# Altium footprint library SparkFun-Connectors.PCBLIB: 409 footprints (part 14 of 26)
Each footprint in its own frame and in the unit in brackets; x right, y up, seen from the top. Pads: shape width x height; smd on the part's side, far side on the other; paste and mask are expansions set on the pad; w line width, h text height; cw(c..) or ccw(c..) is an arc to the next point about the centre after c.
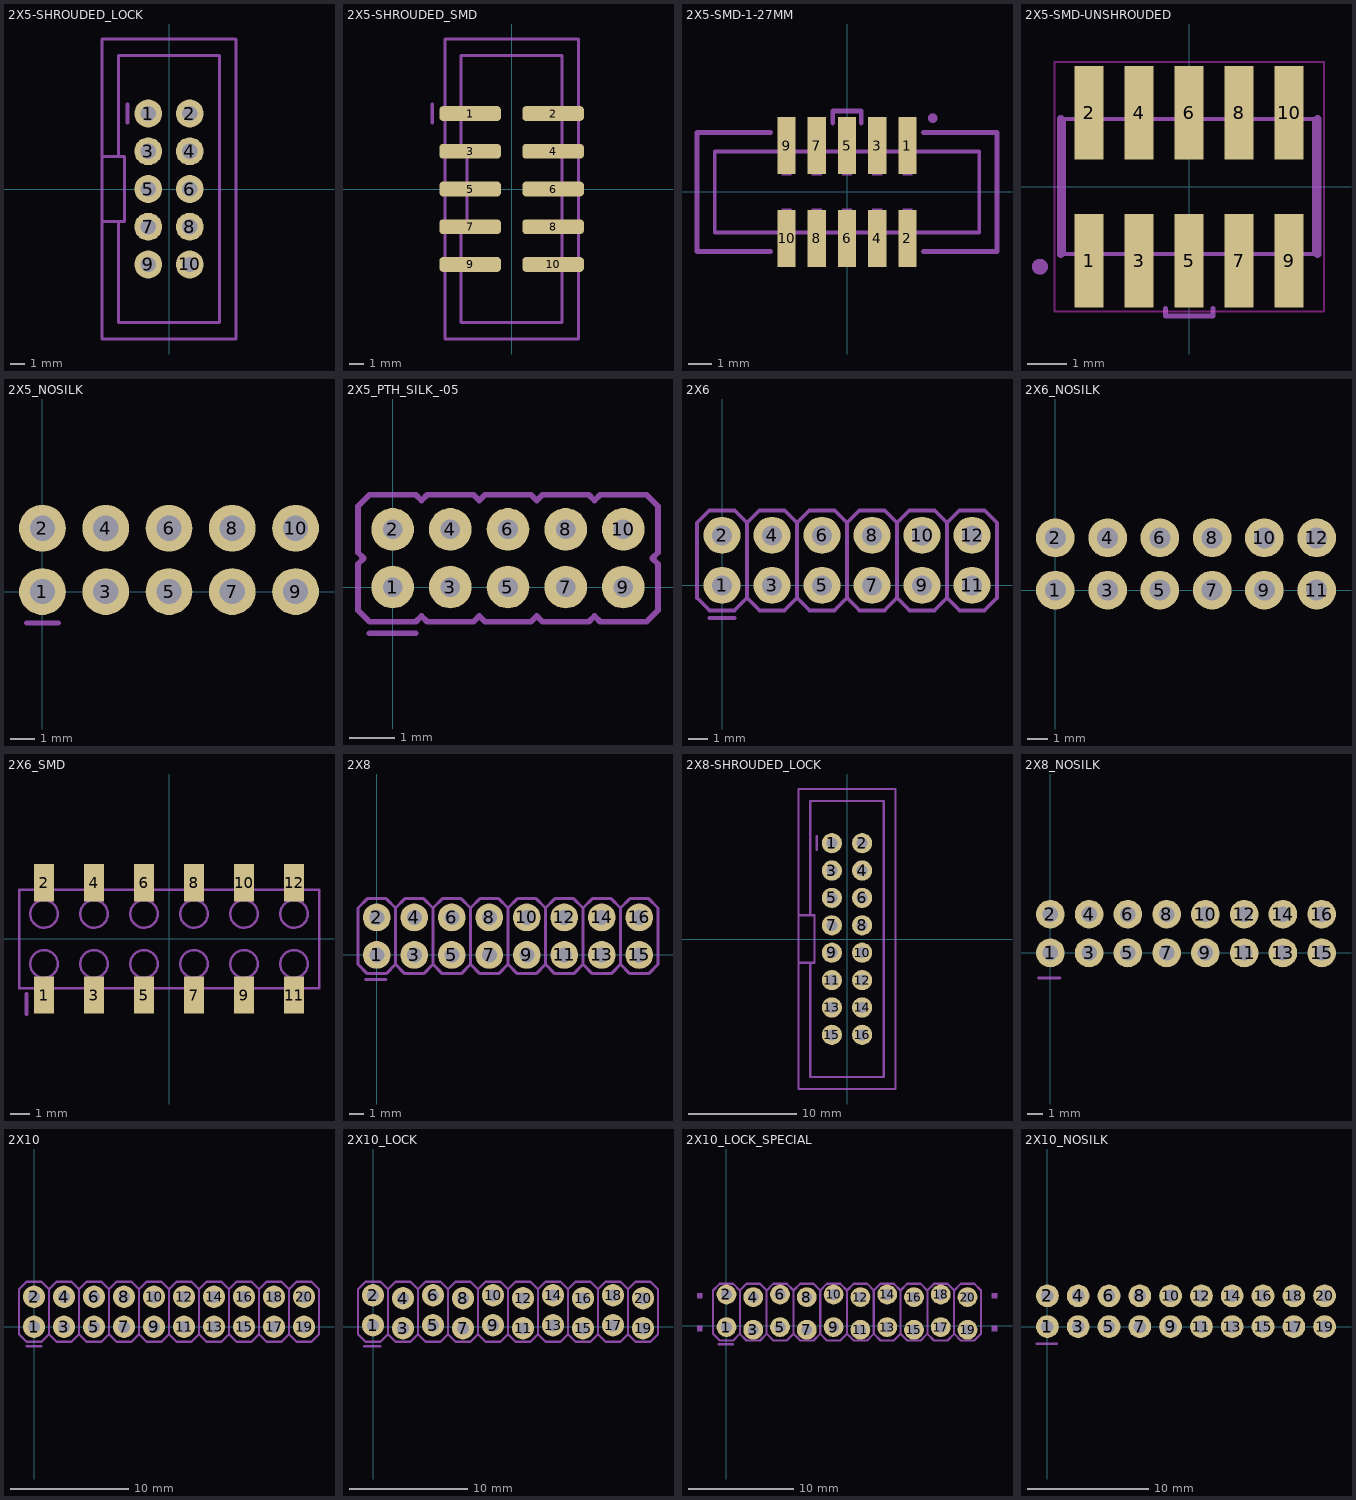
[diagram p13: the footprints below, top view; thin cyan lines are the x and y axes]

## 2X5-SHROUDED_LOCK [mil]
pads (10):
  round 74 hole 40: 1(-55,200) 2(55,200) 3(-55,100) 4(55,100) 5(-55,0) 6(55,0) 7(-55,-100) 8(55,-100) 9(-55,-200) 10(55,-200)
tDocu:
  region: -60,210 -40,210 -40,190 -60,190
  region: 40,210 60,210 60,190 40,190
  region: 40,110 60,110 60,90 40,90
  region: -60,110 -40,110 -40,90 -60,90
  region: 40,10 60,10 60,-10 40,-10
  region: -60,10 -40,10 -40,-10 -60,-10
  region: 40,-90 60,-90 60,-110 40,-110
  region: -60,-90 -40,-90 -40,-110 -60,-110
  region: 40,-190 60,-190 60,-210 40,-210
  region: -60,-190 -40,-190 -40,-210 -60,-210
  region: -60,-90 -40,-90 -40,-110 -60,-110
  region: 40,-90 60,-90 60,-110 40,-110
  lines w8: -133.86,-86.61 -133.86,-354.33 133.86,-354.33 133.86,354.33 -133.86,354.33 -133.86,86.61
tPlace:
  lines w8: -109.25,175 -109.25,225 ; 173.23,397.64 -177.17,397.64 -177.17,86.61 ; 177.17,397.64 177.17,-397.64 -177.17,-397.64 -177.17,-86.61 ; -177.17,-86.61 -177.17,86.61 ; -177.17,-86.61 -118.11,-86.61 -118.11,86.61 -177.17,86.61
bPlace:
  lines w8: -110.75,175 -110.75,225

## 2X5-SHROUDED_SMD [mil]
pads (10):
  rrect50% 163.39x39.37 smd: 1(-110,200) 2(110,200) 3(-110,100) 4(110,100) 5(-110,0) 6(110,0) 7(-110,-100) 8(110,-100) 9(-110,-200) 10(110,-200)
tDocu:
  region: -60,190 -60,210 -40,210 -40,190
  region: 40,190 40,210 60,210 60,190
  region: 40,90 40,110 60,110 60,90
  region: -60,90 -60,110 -40,110 -40,90
  region: 40,-10 40,10 60,10 60,-10
  region: -60,-10 -60,10 -40,10 -40,-10
  region: 40,-110 40,-90 60,-90 60,-110
  region: -60,-110 -60,-90 -40,-90 -40,-110
  region: 40,-210 40,-190 60,-190 60,-210
  region: -60,-210 -60,-190 -40,-190 -40,-210
  region: -60,-110 -60,-90 -40,-90 -40,-110
  region: 40,-110 40,-90 60,-90 60,-110
  lines w8: -133.86,-86.61 -133.86,-354.33 133.86,-354.33 133.86,354.33 -133.86,354.33 -133.86,86.61
tPlace:
  lines w8: -209.25,175 -209.25,225 ; 173.23,397.64 -177.17,397.64 -177.17,86.61 ; 177.17,397.64 177.17,-397.64 -177.17,-397.64 -177.17,-86.61 ; -177.17,-86.61 -177.17,86.61 ; -177.17,-86.61 -118.11,-86.61 -118.11,86.61 -177.17,86.61
bPlace:
  lines w8: -210.75,175 -210.75,225

## 2X5-SMD-1-27MM [mil]
pads (10):
  rect 29.92x94.49 smd: 1(100,76.77) 2(100,-76.77) 3(50,76.77) 4(50,-76.77) 5(0,76.77) 6(0,-76.77) 7(-50,76.77) 8(-50,-76.77) 9(-100,76.77) 10(-100,-76.77)
tDocu:
  region: -8.07,-27.56 8.07,-27.56 8.07,-110.82 -8.07,-110.82
  region: -58.07,-27.56 -41.93,-27.56 -41.93,-110.82 -58.07,-110.82
  region: -108.07,-27.56 -91.93,-27.56 -91.93,-110.82 -108.07,-110.82
  region: 41.93,-27.56 58.07,-27.56 58.07,-110.82 41.93,-110.82
  region: 91.93,-27.56 108.07,-27.56 108.07,-110.82 91.93,-110.82
  region: 108.07,27.56 91.93,27.56 91.93,110.82 108.07,110.82
  region: 58.07,27.56 41.93,27.56 41.93,110.82 58.07,110.82
  region: 8.07,27.56 -8.07,27.56 -8.07,110.82 8.07,110.82
  region: -41.93,27.56 -58.07,27.56 -58.07,110.82 -41.93,110.82
  region: -91.93,27.56 -108.07,27.56 -108.07,110.82 -91.93,110.82
  lines w6: -218.5,-66.93 218.5,-66.93 218.5,66.93 -218.5,66.93 -218.5,-66.93
tPlace:
  circle w8: c141.73,122.05 r3.94
  lines w8: -125.98,-98.43 -248.03,-98.43 -248.03,98.43 -125.98,98.43 ; -23.62,114.17 -23.62,133.86 23.62,133.86 23.62,114.17 ; 125.98,-98.43 248.03,-98.43 248.03,98.43 125.98,98.43

## 2X5-SMD-UNSHROUDED [mm]
pads (10):
  rect 0.74x2.38 smd: 1(-2.54,-1.88) 2(-2.54,1.88) 3(-1.27,-1.88) 4(-1.27,1.88) 5(0,-1.88) 6(0,1.88) 7(1.27,-1.88) 8(1.27,1.88) 9(2.54,-1.88) 10(2.54,1.88)
Top keep-out:
  lines w0.05: -3.425,-3.17 -3.425,3.17 3.425,3.17 3.425,-3.17 -3.425,-3.17
tDocu:
  circle w0.2: c-3.79,-2.035 r0.1
  lines w0.1: -3.175,-1.715 -3.175,1.715 3.175,1.715 3.175,-1.715 -3.175,-1.715
tPlace:
  circle w0.2: c-3.79,-2.035 r0.1
  lines w0.127: -0.6,-3.09 -0.6,-3.29 0.6,-3.29 0.6,-3.09
  lines w0.2: -3.26,-1.715 -3.26,1.715 ; 3.26,-1.715 3.26,1.715

## 2X5_NOSILK [mil]
pads (10):
  round 74 hole 40: 1(0,0) 2(0,100) 3(100,0) 4(100,100) 5(200,0) 6(200,100) 7(300,0) 8(300,100) 9(400,0) 10(400,100)
tDocu:
  region: 10,-10 -10,-10 -10,10 10,10
  region: 10,90 -10,90 -10,110 10,110
  region: 110,90 90,90 90,110 110,110
  region: 110,-10 90,-10 90,10 110,10
  region: 210,-10 190,-10 190,10 210,10
  region: 410,90 390,90 390,110 410,110
  region: 410,-10 390,-10 390,10 410,10
  region: 310,-10 290,-10 290,10 310,10
  region: 310,90 290,90 290,110 310,110
  region: 210,90 190,90 190,110 210,110
  lines w8: -25,-50 25,-50

## 2X5_PTH_SILK_-05 [mil]
pads (10):
  round 37 hole 17: 1(0,0) 2(0,50) 3(50,0) 4(50,50) 5(100,0) 6(100,50) 7(150,0) 8(150,50) 9(200,0) 10(200,50)
tPlace:
  lines w5: -20,-40 20,-40 ; -30,-20 -20,-30 20,-30 25,-25 30,-30 70,-30 75,-25 80,-30 120,-30 125,-25 130,-30 170,-30 175,-25 180,-30 220,-30 230,-20 230,20 225,25 230,30 230,70 220,80 180,80 175,75 170,80 130,80 125,75 120,80 80,80 75,75 70,80 30,80 25,75 20,80 -20,80 -30,70 -30,30 -25,25 -30,20 -30,-20
bPlace:
  lines w5: -20,-40 20,-40

## 2X6 [mil]
pads (12):
  round 74 hole 40: 1(0,0) 2(0,100) 3(100,0) 4(100,100) 5(200,0) 6(200,100) 7(300,0) 8(300,100) 9(400,0) 10(400,100) 11(500,0) 12(500,100)
tDocu:
  region: -10,-10 -10,10 10,10 10,-10
  region: -10,90 -10,110 10,110 10,90
  region: 90,90 90,110 110,110 110,90
  region: 90,-10 90,10 110,10 110,-10
  region: 190,90 190,110 210,110 210,90
  region: 190,-10 190,10 210,10 210,-10
  region: 290,90 290,110 310,110 310,90
  region: 390,90 390,110 410,110 410,90
  region: 490,90 490,110 510,110 510,90
  region: 290,-10 290,10 310,10 310,-10
  region: 390,-10 390,10 410,10 410,-10
  region: 490,-10 490,10 510,10 510,-10
tPlace:
  lines w8: -25,-65 25,-65 ; -50,-25 -25,-50 ; -50,-25 -50,125 ; -50,-25 -25,-50 ; -50,-25 -50,125 ; -50,-25 -25,-50 ; -50,-25 -50,125 ; -50,125 -25,150 ; -50,125 -25,150 ; -50,125 -25,150 ; -25,-50 25,-50 50,-25 ; -25,150 25,150 50,125 ; 50,-25 75,-50 125,-50 150,-25 ; 50,-25 50,125 ; 50,125 75,150 125,150 150,125 ; 150,-25 175,-50 225,-50 250,-25 ; 150,-25 150,125 ; 150,125 175,150 225,150 250,125 ; 250,-25 275,-50 325,-50 350,-25 ; 250,-25 250,125 ; 250,125 275,150 325,150 350,125 ; 350,-25 375,-50 425,-50 450,-25 ; 350,-25 350,125 ; 350,125 375,150 425,150 450,125 ; 450,-25 475,-50 525,-50 550,-25 550,125 525,150 475,150 450,125 ; 450,-25 450,125
bPlace:
  lines w8: -25,-65 25,-65

## 2X6_NOSILK [mil]
pads (12):
  round 74 hole 40: 1(0,0) 2(0,100) 3(100,0) 4(100,100) 5(200,0) 6(200,100) 7(300,0) 8(300,100) 9(400,0) 10(400,100) 11(500,0) 12(500,100)
tDocu:
  region: -10,-10 -10,10 10,10 10,-10
  region: -10,90 -10,110 10,110 10,90
  region: 90,90 90,110 110,110 110,90
  region: 90,-10 90,10 110,10 110,-10
  region: 190,90 190,110 210,110 210,90
  region: 190,-10 190,10 210,10 210,-10
  region: 290,90 290,110 310,110 310,90
  region: 390,90 390,110 410,110 410,90
  region: 490,90 490,110 510,110 510,90
  region: 290,-10 290,10 310,10 310,-10
  region: 390,-10 390,10 410,10 410,-10
  region: 490,-10 490,10 510,10 510,-10

## 2X6_SMD [mil]
pads (12):
  rect 40.16x74.8 smd: 1(-250,-112.2) 2(-250,112.2) 3(-150,-112.2) 4(-150,112.2) 5(-50,-112.2) 6(-50,112.2) 7(50,-112.2) 8(50,112.2) 9(150,-112.2) 10(150,112.2) 11(250,-112.2) 12(250,112.2)
tDocu:
  circle w5: c-150,50 r27.56
  circle w5: c-250,50 r27.56
  circle w5: c-250,-50 r27.56
  circle w5: c-150,-50 r27.56
  circle w5: c-50,-50 r27.56
  circle w5: c-50,50 r27.56
  circle w5: c50,-50 r27.56
  circle w5: c50,50 r27.56
  circle w5: c150,-50 r27.56
  circle w5: c150,50 r27.56
  circle w5: c250,-50 r27.56
  circle w5: c250,50 r27.56
  region: -161.81,100.39 -161.81,131.89 -138.19,131.89 -138.19,100.39
  region: -261.81,100.39 -261.81,131.89 -238.19,131.89 -238.19,100.39
  region: -61.81,100.39 -61.81,131.89 -38.19,131.89 -38.19,100.39
  region: -238.19,-100.39 -238.19,-131.89 -261.81,-131.89 -261.81,-100.39
  region: -138.19,-100.39 -138.19,-131.89 -161.81,-131.89 -161.81,-100.39
  region: -38.19,-100.39 -38.19,-131.89 -61.81,-131.89 -61.81,-100.39
  region: 38.19,100.39 38.19,131.89 61.81,131.89 61.81,100.39
  region: 61.81,-100.39 61.81,-131.89 38.19,-131.89 38.19,-100.39
  region: 138.19,100.39 138.19,131.89 161.81,131.89 161.81,100.39
  region: 161.81,-100.39 161.81,-131.89 138.19,-131.89 138.19,-100.39
  region: 238.19,100.39 238.19,131.89 261.81,131.89 261.81,100.39
  region: 261.81,-100.39 261.81,-131.89 238.19,-131.89 238.19,-100.39
  lines w5: -300,-98.43 -300,98.43 300,98.43 300,-98.43 -300,-98.43
tPlace:
  lines w8: -285,-150 -285,-110

## 2X8 [mil]
pads (16):
  round 74 hole 40: 1(0,0) 2(0,100) 3(100,0) 4(100,100) 5(200,0) 6(200,100) 7(300,0) 8(300,100) 9(400,0) 10(400,100) 11(500,0) 12(500,100) 13(600,0) 14(600,100) 15(700,0) 16(700,100)
tDocu:
  region: -10,-10 -10,10 10,10 10,-10
  region: -10,90 -10,110 10,110 10,90
  region: 90,90 90,110 110,110 110,90
  region: 90,-10 90,10 110,10 110,-10
  region: 190,90 190,110 210,110 210,90
  region: 190,-10 190,10 210,10 210,-10
  region: 290,90 290,110 310,110 310,90
  region: 390,90 390,110 410,110 410,90
  region: 490,90 490,110 510,110 510,90
  region: 290,-10 290,10 310,10 310,-10
  region: 390,-10 390,10 410,10 410,-10
  region: 490,-10 490,10 510,10 510,-10
  region: 590,90 590,110 610,110 610,90
  region: 590,-10 590,10 610,10 610,-10
  region: 690,90 690,110 710,110 710,90
  region: 690,-10 690,10 710,10 710,-10
tPlace:
  lines w8: -30,-65 25,-65 ; 50,-25 25,-50 -25,-50 -50,-25 -50,125 -25,150 25,150 50,125 ; 50,-25 75,-50 125,-50 150,-25 ; 50,-25 50,125 ; 50,125 75,150 125,150 150,125 ; 150,-25 175,-50 225,-50 250,-25 ; 150,-25 150,125 ; 150,125 175,150 225,150 250,125 ; 250,-25 275,-50 325,-50 350,-25 ; 250,-25 250,125 ; 250,125 275,150 325,150 350,125 ; 350,-25 375,-50 425,-50 450,-25 ; 350,-25 350,125 ; 350,125 375,150 425,150 450,125 ; 450,-25 475,-50 525,-50 550,-25 ; 450,-25 450,125 ; 450,125 475,150 525,150 550,125 ; 550,-25 575,-50 625,-50 650,-25 ; 550,-25 550,125 ; 550,125 575,150 625,150 650,125 ; 650,-25 675,-50 725,-50 750,-25 750,125 725,150 675,150 650,125 ; 650,-25 650,125
bPlace:
  lines w8: -30,-65 25,-65

## 2X8-SHROUDED_LOCK [mil]
pads (16):
  round 74 hole 40: 1(-55,350) 2(55,350) 3(-55,250) 4(55,250) 5(-55,150) 6(55,150) 7(-55,50) 8(55,50) 9(-55,-50) 10(55,-50) 11(-55,-150) 12(55,-150) 13(-55,-250) 14(55,-250) 15(-55,-350) 16(55,-350)
tDocu:
  region: -60,360 -40,360 -40,340 -60,340
  region: 40,360 60,360 60,340 40,340
  region: 40,260 60,260 60,240 40,240
  region: -60,260 -40,260 -40,240 -60,240
  region: 40,160 60,160 60,140 40,140
  region: -60,160 -40,160 -40,140 -60,140
  region: 40,60 60,60 60,40 40,40
  region: -60,60 -40,60 -40,40 -60,40
  region: 40,-40 60,-40 60,-60 40,-60
  region: -60,-40 -40,-40 -40,-60 -60,-60
  region: -60,60 -40,60 -40,40 -60,40
  region: 40,60 60,60 60,40 40,40
  region: 40,-140 60,-140 60,-160 40,-160
  region: -60,-140 -40,-140 -40,-160 -60,-160
  region: 40,-240 60,-240 60,-260 40,-260
  region: -60,-240 -40,-240 -40,-260 -60,-260
  region: 40,-340 60,-340 60,-360 40,-360
  region: -60,-340 -40,-340 -40,-360 -60,-360
  lines w8: -133.86,-86.61 -133.86,-504.33 133.86,-504.33 133.86,504.33 -133.86,504.33 -133.86,86.61
tPlace:
  lines w8: -109.25,325 -109.25,375 ; 173.23,547.64 -177.17,547.64 -177.17,86.61 ; 177.17,547.64 177.17,-547.64 -177.17,-547.64 -177.17,-86.61 ; -177.17,-86.61 -177.17,86.61 ; -177.17,-86.61 -118.11,-86.61 -118.11,86.61 -177.17,86.61
bPlace:
  lines w8: -110.75,325 -110.75,375

## 2X8_NOSILK [mil]
pads (16):
  round 74 hole 40: 1(0,0) 2(0,100) 3(100,0) 4(100,100) 5(200,0) 6(200,100) 7(300,0) 8(300,100) 9(400,0) 10(400,100) 11(500,0) 12(500,100) 13(600,0) 14(600,100) 15(700,0) 16(700,100)
tDocu:
  region: -10,-10 -10,10 10,10 10,-10
  region: -10,90 -10,110 10,110 10,90
  region: 90,90 90,110 110,110 110,90
  region: 90,-10 90,10 110,10 110,-10
  region: 190,90 190,110 210,110 210,90
  region: 190,-10 190,10 210,10 210,-10
  region: 290,90 290,110 310,110 310,90
  region: 390,90 390,110 410,110 410,90
  region: 490,90 490,110 510,110 510,90
  region: 290,-10 290,10 310,10 310,-10
  region: 390,-10 390,10 410,10 410,-10
  region: 490,-10 490,10 510,10 510,-10
  region: 590,90 590,110 610,110 610,90
  region: 590,-10 590,10 610,10 610,-10
  region: 690,90 690,110 710,110 710,90
  region: 690,-10 690,10 710,10 710,-10
  lines w8: -30,-65 25,-65
bDocu:
  lines w8: -30,-65 25,-65

## 2X10 [mil]
pads (20):
  round 74 hole 40: 1(0,0) 2(0,100) 3(100,0) 4(100,100) 5(200,0) 6(200,100) 7(300,0) 8(300,100) 9(400,0) 10(400,100) 11(500,0) 12(500,100) 13(600,0) 14(600,100) 15(700,0) 16(700,100) 17(800,0) 18(800,100) 19(900,0) 20(900,100)
tDocu:
  region: -10,-10 -10,10 10,10 10,-10
  region: -10,90 -10,110 10,110 10,90
  region: 90,90 90,110 110,110 110,90
  region: 90,-10 90,10 110,10 110,-10
  region: 190,90 190,110 210,110 210,90
  region: 190,-10 190,10 210,10 210,-10
  region: 290,90 290,110 310,110 310,90
  region: 390,90 390,110 410,110 410,90
  region: 490,90 490,110 510,110 510,90
  region: 290,-10 290,10 310,10 310,-10
  region: 390,-10 390,10 410,10 410,-10
  region: 490,-10 490,10 510,10 510,-10
  region: 590,90 590,110 610,110 610,90
  region: 590,-10 590,10 610,10 610,-10
  region: 690,90 690,110 710,110 710,90
  region: 690,-10 690,10 710,10 710,-10
  region: 790,90 790,110 810,110 810,90
  region: 790,-10 790,10 810,10 810,-10
  region: 890,90 890,110 910,110 910,90
  region: 890,-10 890,10 910,10 910,-10
tPlace:
  lines w8: -25,-65 25,-65 ; 50,-25 25,-50 -25,-50 -50,-25 -50,125 -25,150 25,150 50,125 ; 50,-25 75,-50 125,-50 150,-25 ; 50,-25 50,125 ; 50,125 75,150 125,150 150,125 ; 150,-25 175,-50 225,-50 250,-25 ; 150,-25 150,125 ; 150,125 175,150 225,150 250,125 ; 250,-25 275,-50 325,-50 350,-25 ; 250,-25 250,125 ; 250,125 275,150 325,150 350,125 ; 350,-25 375,-50 425,-50 450,-25 ; 350,-25 350,125 ; 350,125 375,150 425,150 450,125 ; 450,-25 475,-50 525,-50 550,-25 ; 450,-25 450,125 ; 450,125 475,150 525,150 550,125 ; 550,-25 575,-50 625,-50 650,-25 ; 550,-25 550,125 ; 550,125 575,150 625,150 650,125 ; 650,-25 675,-50 725,-50 750,-25 ; 650,-25 650,125 ; 650,125 675,150 725,150 750,125 ; 750,-25 775,-50 825,-50 850,-25 ; 750,-25 750,125 ; 750,125 775,150 825,150 850,125 ; 850,-25 850,125 ; 850,-25 875,-50 925,-50 950,-25 950,125 925,150 875,150 850,125
bPlace:
  lines w8: -25,-65 25,-65

## 2X10_LOCK [mil]
pads (20):
  round 74 hole 40: 1(0,5) 2(0,105) 3(100,-5) 4(100,95) 5(200,5) 6(200,105) 7(300,-5) 8(300,95) 9(400,5) 10(400,105) 11(500,-5) 12(500,95) 13(600,5) 14(600,105) 15(700,-5) 16(700,95) 17(800,5) 18(800,105) 19(900,-5) 20(900,95)
tDocu:
  region: -10,-10 -10,10 10,10 10,-10
  region: -10,90 -10,110 10,110 10,90
  region: 90,90 90,110 110,110 110,90
  region: 90,-10 90,10 110,10 110,-10
  region: 190,90 190,110 210,110 210,90
  region: 190,-10 190,10 210,10 210,-10
  region: 290,90 290,110 310,110 310,90
  region: 390,90 390,110 410,110 410,90
  region: 490,90 490,110 510,110 510,90
  region: 290,-10 290,10 310,10 310,-10
  region: 390,-10 390,10 410,10 410,-10
  region: 490,-10 490,10 510,10 510,-10
  region: 590,90 590,110 610,110 610,90
  region: 590,-10 590,10 610,10 610,-10
  region: 690,90 690,110 710,110 710,90
  region: 690,-10 690,10 710,10 710,-10
  region: 790,90 790,110 810,110 810,90
  region: 790,-10 790,10 810,10 810,-10
  region: 890,90 890,110 910,110 910,90
  region: 890,-10 890,10 910,10 910,-10
tPlace:
  lines w8: -30,-65 25,-65 ; 50,-25 25,-50 -25,-50 -50,-25 -50,125 -25,150 25,150 50,125 ; 50,-25 75,-50 125,-50 150,-25 ; 50,-25 50,125 ; 50,125 75,150 125,150 150,125 ; 150,-25 175,-50 225,-50 250,-25 ; 150,-25 150,125 ; 150,125 175,150 225,150 250,125 ; 250,-25 275,-50 325,-50 350,-25 ; 250,-25 250,125 ; 250,125 275,150 325,150 350,125 ; 350,-25 375,-50 425,-50 450,-25 ; 350,-25 350,125 ; 350,125 375,150 425,150 450,125 ; 450,-25 475,-50 525,-50 550,-25 ; 450,-25 450,125 ; 450,125 475,150 525,150 550,125 ; 550,-25 575,-50 625,-50 650,-25 ; 550,-25 550,125 ; 550,125 575,150 625,150 650,125 ; 650,-25 675,-50 725,-50 750,-25 ; 650,-25 650,125 ; 650,125 675,150 725,150 750,125 ; 750,-25 775,-50 825,-50 850,-25 ; 750,-25 750,125 ; 750,125 775,150 825,150 850,125 ; 850,-25 850,125 ; 850,-25 875,-50 925,-50 950,-25 950,125 925,150 875,150 850,125
bPlace:
  lines w8: -30,-65 25,-65

## 2X10_LOCK_SPECIAL [mil]
pads (20):
  round 74 hole 40: 1(0,-6) 2(0,116) 3(100,-16) 4(100,106) 5(200,-6) 6(200,116) 7(300,-16) 8(300,106) 9(400,-6) 10(400,116) 11(500,-16) 12(500,106) 13(600,-6) 14(600,116) 15(700,-16) 16(700,106) 17(800,-6) 18(800,116) 19(900,-16) 20(900,106)
tDocu:
  region: -10,-21 -10,-1 10,-1 10,-21
  region: -10,101 -10,121 10,121 10,101
  region: 90,101 90,121 110,121 110,101
  region: 90,-21 90,-1 110,-1 110,-21
  region: 190,101 190,121 210,121 210,101
  region: 190,-21 190,-1 210,-1 210,-21
  region: 290,101 290,121 310,121 310,101
  region: 390,101 390,121 410,121 410,101
  region: 490,101 490,121 510,121 510,101
  region: 290,-21 290,-1 310,-1 310,-21
  region: 390,-21 390,-1 410,-1 410,-21
  region: 490,-21 490,-1 510,-1 510,-21
  region: 590,101 590,121 610,121 610,101
  region: 590,-21 590,-1 610,-1 610,-21
  region: 690,101 690,121 710,121 710,101
  region: 690,-21 690,-1 710,-1 710,-21
  region: 790,101 790,121 810,121 810,101
  region: 790,-21 790,-1 810,-1 810,-21
  region: 890,101 890,121 910,121 910,101
  region: 890,-21 890,-1 910,-1 910,-21
  region: -110,101 -110,121 -90,121 -90,101
  region: -110,-21 -110,-1 -90,-1 -90,-21
  region: 990,101 990,121 1010,121 1010,101
  region: 990,-21 990,-1 1010,-1 1010,-21
tPlace:
  lines w8: -30,-70 25,-70 ; 50,-31 25,-56 -25,-56 -50,-31 -50,131 -25,156 25,156 50,131 ; 50,-31 75,-56 125,-56 150,-31 ; 50,-31 50,131 ; 50,131 75,156 125,156 150,131 ; 150,-31 175,-56 225,-56 250,-31 ; 150,-31 150,131 ; 150,131 175,156 225,156 250,131 ; 250,-31 275,-56 325,-56 350,-31 ; 250,-31 250,131 ; 250,131 275,156 325,156 350,131 ; 350,-31 375,-56 425,-56 450,-31 ; 350,-31 350,131 ; 350,131 375,156 425,156 450,131 ; 450,-31 475,-56 525,-56 550,-31 ; 450,-31 450,131 ; 450,131 475,156 525,156 550,131 ; 550,-31 575,-56 625,-56 650,-31 ; 550,-31 550,131 ; 550,131 575,156 625,156 650,131 ; 650,-31 675,-56 725,-56 750,-31 ; 650,-31 650,131 ; 650,131 675,156 725,156 750,131 ; 750,-31 775,-56 825,-56 850,-31 ; 750,-31 750,131 ; 750,131 775,156 825,156 850,131 ; 850,-31 850,131 ; 850,-31 875,-56 925,-56 950,-31 950,131 925,156 875,156 850,131
bPlace:
  lines w8: -30,-70 25,-70

## 2X10_NOSILK [mil]
pads (20):
  round 74 hole 40: 1(0,0) 2(0,100) 3(100,0) 4(100,100) 5(200,0) 6(200,100) 7(300,0) 8(300,100) 9(400,0) 10(400,100) 11(500,0) 12(500,100) 13(600,0) 14(600,100) 15(700,0) 16(700,100) 17(800,0) 18(800,100) 19(900,0) 20(900,100)
tDocu:
  region: -10,-10 -10,10 10,10 10,-10
  region: -10,90 -10,110 10,110 10,90
  region: 90,90 90,110 110,110 110,90
  region: 90,-10 90,10 110,10 110,-10
  region: 190,90 190,110 210,110 210,90
  region: 190,-10 190,10 210,10 210,-10
  region: 290,90 290,110 310,110 310,90
  region: 390,90 390,110 410,110 410,90
  region: 490,90 490,110 510,110 510,90
  region: 290,-10 290,10 310,10 310,-10
  region: 390,-10 390,10 410,10 410,-10
  region: 490,-10 490,10 510,10 510,-10
  region: 590,90 590,110 610,110 610,90
  region: 590,-10 590,10 610,10 610,-10
  region: 690,90 690,110 710,110 710,90
  region: 690,-10 690,10 710,10 710,-10
  region: 790,90 790,110 810,110 810,90
  region: 790,-10 790,10 810,10 810,-10
  region: 890,90 890,110 910,110 910,90
  region: 890,-10 890,10 910,10 910,-10
  lines w8: -35,-55 30,-55
bDocu:
  lines w8: -35,-55 30,-55